# Altium schematic symbol library jlcpcb_2025_04_capacitors_extended_0805.schlib: 3281 symbols (part 8 of 18)
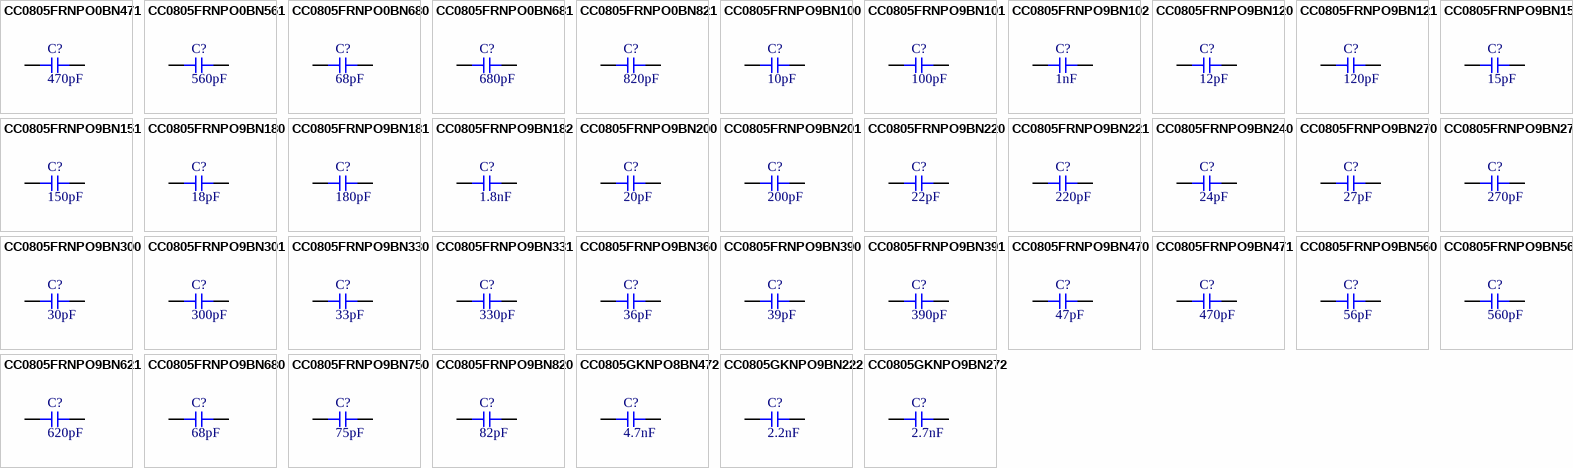
[diagram p89: symbols CC0805FRNPO0BN471 to CC0805GKNPO9BN272]

## CC0805FRNPO0BN680
designator C?  Capacitance: 68pF  (hidden comment: *)
Capacitor, Ceramic (MLCC), 68pF, ±1%, 100V, NP0, ±1%, SMD 0805; Manufacturer: YAGEO; Manufacturer Part Number: CC0805FRNPO0BN680; Package Size: 0805; JLCPCB Basic Part: No; JLCPCB Part Number: C576904; Supplier 1: LCSC; Category: Capacitors - MLCC; Supplier Part Number 1: C576904; Tolerance: ±1%; Voltage Rating: 100V; Temperature Coefficient: NP0; RoHS: Yes; ComponentLink1Description: Datasheet; ComponentLink1URL: https://wmsc.lcsc.com/wmsc/upload/file/pdf/v2/lcsc/2212091030_YAGEO-CC0805FRNPO0BN680_C576904.pdf; ComponentLink2Description: JLCPCB Part URL; ComponentLink2URL: https://jlcpcb.com/partdetail/C576904; ComponentLink3Description: LCSC Part URL; ComponentLink3URL: https://lcsc.com/product-detail/Multilayer-Ceramic-Capacitors-MLCC---SMD-SMT_YAGEO-YAGEO-CC0805FRNPO0BN680_C576904.html
footprint CAP-0805 (0805 (2012M) Capacitor)
pins: 1, 2

## CC0805FRNPO0BN681
designator C?  Capacitance: 680pF  (hidden comment: *)
Capacitor, Ceramic (MLCC), 680pF, ±1%, 100V, NP0, ±1%, SMD 0805; Manufacturer: YAGEO; Manufacturer Part Number: CC0805FRNPO0BN681; Package Size: 0805; JLCPCB Basic Part: No; JLCPCB Part Number: C576905; Supplier 1: LCSC; Category: Capacitors - MLCC; Supplier Part Number 1: C576905; Tolerance: ±1%; Voltage Rating: 100V; Temperature Coefficient: NP0; RoHS: Yes; ComponentLink1Description: Datasheet; ComponentLink1URL: https://wmsc.lcsc.com/wmsc/upload/file/pdf/v2/lcsc/2212222108_YAGEO-CC0805FRNPO0BN681_C576905.pdf; ComponentLink2Description: JLCPCB Part URL; ComponentLink2URL: https://jlcpcb.com/partdetail/C576905; ComponentLink3Description: LCSC Part URL; ComponentLink3URL: https://lcsc.com/product-detail/Multilayer-Ceramic-Capacitors-MLCC---SMD-SMT_YAGEO-YAGEO-CC0805FRNPO0BN681_C576905.html
footprint CAP-0805 (0805 (2012M) Capacitor)
pins: 1, 2

## CC0805FRNPO0BN821
designator C?  Capacitance: 820pF  (hidden comment: *)
Capacitor, Ceramic (MLCC), 820pF, ±1%, 100V, NP0, ±1%, SMD 0805; Manufacturer: YAGEO; Manufacturer Part Number: CC0805FRNPO0BN821; Package Size: 0805; JLCPCB Basic Part: No; JLCPCB Part Number: C576908; Supplier 1: LCSC; Category: Capacitors - MLCC; Supplier Part Number 1: C576908; Tolerance: ±1%; Voltage Rating: 100V; Temperature Coefficient: NP0; RoHS: Yes; ComponentLink1Description: Datasheet; ComponentLink1URL: https://wmsc.lcsc.com/wmsc/upload/file/pdf/v2/lcsc/2211161830_YAGEO-CC0805FRNPO0BN821_C576908.pdf; ComponentLink2Description: JLCPCB Part URL; ComponentLink2URL: https://jlcpcb.com/partdetail/C576908; ComponentLink3Description: LCSC Part URL; ComponentLink3URL: https://lcsc.com/product-detail/Multilayer-Ceramic-Capacitors-MLCC---SMD-SMT_YAGEO-YAGEO-CC0805FRNPO0BN821_C576908.html
footprint CAP-0805 (0805 (2012M) Capacitor)
pins: 1, 2

## CC0805FRNPO9BN100
designator C?  Capacitance: 10pF  (hidden comment: *)
Capacitor, Ceramic (MLCC), 10pF, ±1%, 50V, NP0, ±1%, SMD 0805; Manufacturer: YAGEO; Manufacturer Part Number: CC0805FRNPO9BN100; Package Size: 0805; JLCPCB Basic Part: No; JLCPCB Part Number: C541512; Supplier 1: LCSC; Category: Capacitors - MLCC; Supplier Part Number 1: C541512; Tolerance: ±1%; Voltage Rating: 50V; Temperature Coefficient: NP0; RoHS: Yes; ComponentLink1Description: Datasheet; ComponentLink1URL: https://wmsc.lcsc.com/wmsc/upload/file/pdf/v2/lcsc/2006151142_YAGEO-CC0805FRNPO9BN100_C541512.pdf; ComponentLink2Description: JLCPCB Part URL; ComponentLink2URL: https://jlcpcb.com/partdetail/C541512; ComponentLink3Description: LCSC Part URL; ComponentLink3URL: https://lcsc.com/product-detail/Multilayer-Ceramic-Capacitors-MLCC---SMD-SMT_YAGEO-YAGEO-CC0805FRNPO9BN100_C541512.html
footprint CAP-0805 (0805 (2012M) Capacitor)
pins: 1, 2

## CC0805FRNPO9BN101
designator C?  Capacitance: 100pF  (hidden comment: *)
Capacitor, Ceramic (MLCC), 100pF, 50V, NP0, SMD 0805; Manufacturer: YAGEO; Manufacturer Part Number: CC0805FRNPO9BN101; Package Size: 0805; JLCPCB Basic Part: No; JLCPCB Part Number: C541513; Supplier 1: LCSC; Category: Capacitors - MLCC; Supplier Part Number 1: C541513; Voltage Rating: 50V; Temperature Coefficient: NP0; RoHS: Yes; ComponentLink1Description: Datasheet; ComponentLink1URL: https://wmsc.lcsc.com/wmsc/upload/file/pdf/v2/lcsc/2006151142_YAGEO-CC0805FRNPO9BN101_C541513.pdf; ComponentLink2Description: JLCPCB Part URL; ComponentLink2URL: https://jlcpcb.com/partdetail/C541513; ComponentLink3Description: LCSC Part URL; ComponentLink3URL: https://lcsc.com/product-detail/Multilayer-Ceramic-Capacitors-MLCC---SMD-SMT_YAGEO-YAGEO-CC0805FRNPO9BN101_C541513.html
footprint CAP-0805 (0805 (2012M) Capacitor)
pins: 1, 2

## CC0805FRNPO9BN102
designator C?  Capacitance: 1nF  (hidden comment: *)
Capacitor, Ceramic (MLCC), 1nF, ±1%, 50V, NP0, ±1%, SMD 0805; Manufacturer: YAGEO; Manufacturer Part Number: CC0805FRNPO9BN102; Package Size: 0805; JLCPCB Basic Part: No; JLCPCB Part Number: C326587; Supplier 1: LCSC; Category: Capacitors - MLCC; Supplier Part Number 1: C326587; Tolerance: ±1%; Voltage Rating: 50V; Temperature Coefficient: NP0; RoHS: Yes; ComponentLink1Description: Datasheet; ComponentLink1URL: https://wmsc.lcsc.com/wmsc/upload/file/pdf/v2/lcsc/1811141241_YAGEO-CC0805FRNPO9BN102_C326587.pdf; ComponentLink2Description: JLCPCB Part URL; ComponentLink2URL: https://jlcpcb.com/partdetail/C326587; ComponentLink3Description: LCSC Part URL; ComponentLink3URL: https://lcsc.com/product-detail/Multilayer-Ceramic-Capacitors-MLCC---SMD-SMT_YAGEO-YAGEO-CC0805FRNPO9BN102_C326587.html
footprint CAP-0805 (0805 (2012M) Capacitor)
pins: 1, 2

## CC0805FRNPO9BN120
designator C?  Capacitance: 12pF  (hidden comment: *)
Capacitor, Ceramic (MLCC), 12pF, ±1%, 50V, NP0, ±1%, SMD 0805; Manufacturer: YAGEO; Manufacturer Part Number: CC0805FRNPO9BN120; Package Size: 0805; JLCPCB Basic Part: No; JLCPCB Part Number: C541514; Supplier 1: LCSC; Category: Capacitors - MLCC; Supplier Part Number 1: C541514; Tolerance: ±1%; Voltage Rating: 50V; Temperature Coefficient: NP0; RoHS: Yes; ComponentLink1Description: Datasheet; ComponentLink1URL: https://wmsc.lcsc.com/wmsc/upload/file/pdf/v2/lcsc/2006151142_YAGEO-CC0805FRNPO9BN120_C541514.pdf; ComponentLink2Description: JLCPCB Part URL; ComponentLink2URL: https://jlcpcb.com/partdetail/C541514; ComponentLink3Description: LCSC Part URL; ComponentLink3URL: https://lcsc.com/product-detail/Multilayer-Ceramic-Capacitors-MLCC---SMD-SMT_YAGEO-YAGEO-CC0805FRNPO9BN120_C541514.html
footprint CAP-0805 (0805 (2012M) Capacitor)
pins: 1, 2

## CC0805FRNPO9BN121
designator C?  Capacitance: 120pF  (hidden comment: *)
Capacitor, Ceramic (MLCC), 120pF, ±1%, 50V, NP0, ±1%, SMD 0805; Manufacturer: YAGEO; Manufacturer Part Number: CC0805FRNPO9BN121; Package Size: 0805; JLCPCB Basic Part: No; JLCPCB Part Number: C527076; Supplier 1: LCSC; Category: Capacitors - MLCC; Supplier Part Number 1: C527076; Tolerance: ±1%; Voltage Rating: 50V; Temperature Coefficient: NP0; RoHS: Yes; ComponentLink1Description: Datasheet; ComponentLink1URL: https://wmsc.lcsc.com/wmsc/upload/file/pdf/v2/lcsc/2006181535_YAGEO-CC0805FRNPO9BN121_C527076.pdf; ComponentLink2Description: JLCPCB Part URL; ComponentLink2URL: https://jlcpcb.com/partdetail/C527076; ComponentLink3Description: LCSC Part URL; ComponentLink3URL: https://lcsc.com/product-detail/Multilayer-Ceramic-Capacitors-MLCC---SMD-SMT_YAGEO-YAGEO-CC0805FRNPO9BN121_C527076.html
footprint CAP-0805 (0805 (2012M) Capacitor)
pins: 1, 2

## CC0805FRNPO9BN150
designator C?  Capacitance: 15pF  (hidden comment: *)
Capacitor, Ceramic (MLCC), 15pF, ±1%, 50V, NP0, ±1%, SMD 0805; Manufacturer: YAGEO; Manufacturer Part Number: CC0805FRNPO9BN150; Package Size: 0805; JLCPCB Basic Part: No; JLCPCB Part Number: C527077; Supplier 1: LCSC; Category: Capacitors - MLCC; Supplier Part Number 1: C527077; Tolerance: ±1%; Voltage Rating: 50V; Temperature Coefficient: NP0; RoHS: Yes; ComponentLink1Description: Datasheet; ComponentLink1URL: https://wmsc.lcsc.com/wmsc/upload/file/pdf/v2/lcsc/2006101835_YAGEO-CC0805FRNPO9BN150_C527077.pdf; ComponentLink2Description: JLCPCB Part URL; ComponentLink2URL: https://jlcpcb.com/partdetail/C527077; ComponentLink3Description: LCSC Part URL; ComponentLink3URL: https://lcsc.com/product-detail/Multilayer-Ceramic-Capacitors-MLCC---SMD-SMT_YAGEO-YAGEO-CC0805FRNPO9BN150_C527077.html
footprint CAP-0805 (0805 (2012M) Capacitor)
pins: 1, 2

## CC0805FRNPO9BN151
designator C?  Capacitance: 150pF  (hidden comment: *)
Capacitor, Ceramic (MLCC), 150pF, ±1%, 50V, NP0, ±1%, SMD 0805; Manufacturer: YAGEO; Manufacturer Part Number: CC0805FRNPO9BN151; Package Size: 0805; JLCPCB Basic Part: No; JLCPCB Part Number: C527078; Supplier 1: LCSC; Category: Capacitors - MLCC; Supplier Part Number 1: C527078; Tolerance: ±1%; Voltage Rating: 50V; Temperature Coefficient: NP0; RoHS: Yes; ComponentLink1Description: Datasheet; ComponentLink1URL: https://wmsc.lcsc.com/wmsc/upload/file/pdf/v2/lcsc/2006101835_YAGEO-CC0805FRNPO9BN151_C527078.pdf; ComponentLink2Description: JLCPCB Part URL; ComponentLink2URL: https://jlcpcb.com/partdetail/C527078; ComponentLink3Description: LCSC Part URL; ComponentLink3URL: https://lcsc.com/product-detail/Multilayer-Ceramic-Capacitors-MLCC---SMD-SMT_YAGEO-YAGEO-CC0805FRNPO9BN151_C527078.html
footprint CAP-0805 (0805 (2012M) Capacitor)
pins: 1, 2

## CC0805FRNPO9BN180
designator C?  Capacitance: 18pF  (hidden comment: *)
Capacitor, Ceramic (MLCC), 18pF, ±1%, 50V, NP0, ±1%, SMD 0805; Manufacturer: YAGEO; Manufacturer Part Number: CC0805FRNPO9BN180; Package Size: 0805; JLCPCB Basic Part: No; JLCPCB Part Number: C527079; Supplier 1: LCSC; Category: Capacitors - MLCC; Supplier Part Number 1: C527079; Tolerance: ±1%; Voltage Rating: 50V; Temperature Coefficient: NP0; RoHS: Yes; ComponentLink1Description: Datasheet; ComponentLink1URL: https://wmsc.lcsc.com/wmsc/upload/file/pdf/v2/lcsc/2007171236_YAGEO-CC0805FRNPO9BN180_C527079.pdf; ComponentLink2Description: JLCPCB Part URL; ComponentLink2URL: https://jlcpcb.com/partdetail/C527079; ComponentLink3Description: LCSC Part URL; ComponentLink3URL: https://lcsc.com/product-detail/Multilayer-Ceramic-Capacitors-MLCC---SMD-SMT_YAGEO-YAGEO-CC0805FRNPO9BN180_C527079.html
footprint CAP-0805 (0805 (2012M) Capacitor)
pins: 1, 2

## CC0805FRNPO9BN181
designator C?  Capacitance: 180pF  (hidden comment: *)
Capacitor, Ceramic (MLCC), 180pF, ±1%, 50V, NP0, ±1%, SMD 0805; Manufacturer: YAGEO; Manufacturer Part Number: CC0805FRNPO9BN181; Package Size: 0805; JLCPCB Basic Part: No; JLCPCB Part Number: C527080; Supplier 1: LCSC; Category: Capacitors - MLCC; Supplier Part Number 1: C527080; Tolerance: ±1%; Voltage Rating: 50V; Temperature Coefficient: NP0; RoHS: Yes; ComponentLink1Description: Datasheet; ComponentLink1URL: https://wmsc.lcsc.com/wmsc/upload/file/pdf/v2/lcsc/2007091834_YAGEO-CC0805FRNPO9BN181_C527080.pdf; ComponentLink2Description: JLCPCB Part URL; ComponentLink2URL: https://jlcpcb.com/partdetail/C527080; ComponentLink3Description: LCSC Part URL; ComponentLink3URL: https://lcsc.com/product-detail/Multilayer-Ceramic-Capacitors-MLCC---SMD-SMT_YAGEO-YAGEO-CC0805FRNPO9BN181_C527080.html
footprint CAP-0805 (0805 (2012M) Capacitor)
pins: 1, 2

## CC0805FRNPO9BN182
designator C?  Capacitance: 1.8nF  (hidden comment: *)
Capacitor, Ceramic (MLCC), 1.8nF, ±1%, 50V, NP0, ±1%, SMD 0805; Manufacturer: YAGEO; Manufacturer Part Number: CC0805FRNPO9BN182; Package Size: 0805; JLCPCB Basic Part: No; JLCPCB Part Number: C541573; Supplier 1: LCSC; Category: Capacitors - MLCC; Supplier Part Number 1: C541573; Tolerance: ±1%; Voltage Rating: 50V; Temperature Coefficient: NP0; RoHS: Yes; ComponentLink1Description: Datasheet; ComponentLink1URL: https://wmsc.lcsc.com/wmsc/upload/file/pdf/v2/lcsc/2006151213_YAGEO-CC0805FRNPO9BN182_C541573.pdf; ComponentLink2Description: JLCPCB Part URL; ComponentLink2URL: https://jlcpcb.com/partdetail/C541573; ComponentLink3Description: LCSC Part URL; ComponentLink3URL: https://lcsc.com/product-detail/Multilayer-Ceramic-Capacitors-MLCC---SMD-SMT_YAGEO-YAGEO-CC0805FRNPO9BN182_C541573.html
footprint CAP-0805 (0805 (2012M) Capacitor)
pins: 1, 2

## CC0805FRNPO9BN200
designator C?  Capacitance: 20pF  (hidden comment: *)
Capacitor, Ceramic (MLCC), 20pF, ±1%, 50V, NP0, ±1%, SMD 0805; Manufacturer: YAGEO; Manufacturer Part Number: CC0805FRNPO9BN200; Package Size: 0805; JLCPCB Basic Part: No; JLCPCB Part Number: C527081; Supplier 1: LCSC; Category: Capacitors - MLCC; Supplier Part Number 1: C527081; Tolerance: ±1%; Voltage Rating: 50V; Temperature Coefficient: NP0; RoHS: Yes; ComponentLink1Description: Datasheet; ComponentLink1URL: https://wmsc.lcsc.com/wmsc/upload/file/pdf/v2/lcsc/2005262134_YAGEO-CC0805FRNPO9BN200_C527081.pdf; ComponentLink2Description: JLCPCB Part URL; ComponentLink2URL: https://jlcpcb.com/partdetail/C527081; ComponentLink3Description: LCSC Part URL; ComponentLink3URL: https://lcsc.com/product-detail/Multilayer-Ceramic-Capacitors-MLCC---SMD-SMT_YAGEO-YAGEO-CC0805FRNPO9BN200_C527081.html
footprint CAP-0805 (0805 (2012M) Capacitor)
pins: 1, 2

## CC0805FRNPO9BN201
designator C?  Capacitance: 200pF  (hidden comment: *)
Capacitor, Ceramic (MLCC), 200pF, 50V, NP0, SMD 0805; Manufacturer: YAGEO; Manufacturer Part Number: CC0805FRNPO9BN201; Package Size: 0805; JLCPCB Basic Part: No; JLCPCB Part Number: C541566; Supplier 1: LCSC; Category: Capacitors - MLCC; Supplier Part Number 1: C541566; Voltage Rating: 50V; Temperature Coefficient: NP0; RoHS: Yes; ComponentLink1Description: Datasheet; ComponentLink1URL: https://wmsc.lcsc.com/wmsc/upload/file/pdf/v2/lcsc/2006151213_YAGEO-CC0805FRNPO9BN201_C541566.pdf; ComponentLink2Description: JLCPCB Part URL; ComponentLink2URL: https://jlcpcb.com/partdetail/C541566; ComponentLink3Description: LCSC Part URL; ComponentLink3URL: https://lcsc.com/product-detail/Multilayer-Ceramic-Capacitors-MLCC---SMD-SMT_YAGEO-YAGEO-CC0805FRNPO9BN201_C541566.html
footprint CAP-0805 (0805 (2012M) Capacitor)
pins: 1, 2

## CC0805FRNPO9BN220
designator C?  Capacitance: 22pF  (hidden comment: *)
Capacitor, Ceramic (MLCC), 22pF, ±1%, 50V, NP0, ±1%, SMD 0805; Manufacturer: YAGEO; Manufacturer Part Number: CC0805FRNPO9BN220; Package Size: 0805; JLCPCB Basic Part: No; JLCPCB Part Number: C541515; Supplier 1: LCSC; Category: Capacitors - MLCC; Supplier Part Number 1: C541515; Tolerance: ±1%; Voltage Rating: 50V; Temperature Coefficient: NP0; RoHS: Yes; ComponentLink1Description: Datasheet; ComponentLink1URL: https://wmsc.lcsc.com/wmsc/upload/file/pdf/v2/lcsc/2006151142_YAGEO-CC0805FRNPO9BN220_C541515.pdf; ComponentLink2Description: JLCPCB Part URL; ComponentLink2URL: https://jlcpcb.com/partdetail/C541515; ComponentLink3Description: LCSC Part URL; ComponentLink3URL: https://lcsc.com/product-detail/Multilayer-Ceramic-Capacitors-MLCC---SMD-SMT_YAGEO-YAGEO-CC0805FRNPO9BN220_C541515.html
footprint CAP-0805 (0805 (2012M) Capacitor)
pins: 1, 2

## CC0805FRNPO9BN221
designator C?  Capacitance: 220pF  (hidden comment: *)
Capacitor, Ceramic (MLCC), 220pF, 50V, NP0, SMD 0805; Manufacturer: YAGEO; Manufacturer Part Number: CC0805FRNPO9BN221; Package Size: 0805; JLCPCB Basic Part: No; JLCPCB Part Number: C541563; Supplier 1: LCSC; Category: Capacitors - MLCC; Supplier Part Number 1: C541563; Voltage Rating: 50V; Temperature Coefficient: NP0; RoHS: Yes; ComponentLink1Description: Datasheet; ComponentLink1URL: https://wmsc.lcsc.com/wmsc/upload/file/pdf/v2/lcsc/2006151213_YAGEO-CC0805FRNPO9BN221_C541563.pdf; ComponentLink2Description: JLCPCB Part URL; ComponentLink2URL: https://jlcpcb.com/partdetail/C541563; ComponentLink3Description: LCSC Part URL; ComponentLink3URL: https://lcsc.com/product-detail/Multilayer-Ceramic-Capacitors-MLCC---SMD-SMT_YAGEO-YAGEO-CC0805FRNPO9BN221_C541563.html
footprint CAP-0805 (0805 (2012M) Capacitor)
pins: 1, 2

## CC0805FRNPO9BN240
designator C?  Capacitance: 24pF  (hidden comment: *)
Capacitor, Ceramic (MLCC), 24pF, ±1%, 50V, NP0, ±1%, SMD 0805; Manufacturer: YAGEO; Manufacturer Part Number: CC0805FRNPO9BN240; Package Size: 0805; JLCPCB Basic Part: No; JLCPCB Part Number: C527082; Supplier 1: LCSC; Category: Capacitors - MLCC; Supplier Part Number 1: C527082; Tolerance: ±1%; Voltage Rating: 50V; Temperature Coefficient: NP0; RoHS: Yes; ComponentLink1Description: Datasheet; ComponentLink1URL: https://wmsc.lcsc.com/wmsc/upload/file/pdf/v2/lcsc/2008201233_YAGEO-CC0805FRNPO9BN240_C527082.pdf; ComponentLink2Description: JLCPCB Part URL; ComponentLink2URL: https://jlcpcb.com/partdetail/C527082; ComponentLink3Description: LCSC Part URL; ComponentLink3URL: https://lcsc.com/product-detail/Multilayer-Ceramic-Capacitors-MLCC---SMD-SMT_YAGEO-YAGEO-CC0805FRNPO9BN240_C527082.html
footprint CAP-0805 (0805 (2012M) Capacitor)
pins: 1, 2

## CC0805FRNPO9BN270
designator C?  Capacitance: 27pF  (hidden comment: *)
Capacitor, Ceramic (MLCC), 27pF, ±1%, 50V, NP0, ±1%, SMD 0805; Manufacturer: YAGEO; Manufacturer Part Number: CC0805FRNPO9BN270; Package Size: 0805; JLCPCB Basic Part: No; JLCPCB Part Number: C527182; Supplier 1: LCSC; Category: Capacitors - MLCC; Supplier Part Number 1: C527182; Tolerance: ±1%; Voltage Rating: 50V; Temperature Coefficient: NP0; RoHS: Yes; ComponentLink1Description: Datasheet; ComponentLink1URL: https://wmsc.lcsc.com/wmsc/upload/file/pdf/v2/lcsc/2008201233_YAGEO-CC0805FRNPO9BN270_C527182.pdf; ComponentLink2Description: JLCPCB Part URL; ComponentLink2URL: https://jlcpcb.com/partdetail/C527182; ComponentLink3Description: LCSC Part URL; ComponentLink3URL: https://lcsc.com/product-detail/Multilayer-Ceramic-Capacitors-MLCC---SMD-SMT_YAGEO-YAGEO-CC0805FRNPO9BN270_C527182.html
footprint CAP-0805 (0805 (2012M) Capacitor)
pins: 1, 2

## CC0805FRNPO9BN271
designator C?  Capacitance: 270pF  (hidden comment: *)
Capacitor, Ceramic (MLCC), 270pF, ±1%, 50V, NP0, ±1%, SMD 0805; Manufacturer: YAGEO; Manufacturer Part Number: CC0805FRNPO9BN271; Package Size: 0805; JLCPCB Basic Part: No; JLCPCB Part Number: C527183; Supplier 1: LCSC; Category: Capacitors - MLCC; Supplier Part Number 1: C527183; Tolerance: ±1%; Voltage Rating: 50V; Temperature Coefficient: NP0; RoHS: Yes; ComponentLink1Description: Datasheet; ComponentLink1URL: https://wmsc.lcsc.com/wmsc/upload/file/pdf/v2/lcsc/2005262134_YAGEO-CC0805FRNPO9BN271_C527183.pdf; ComponentLink2Description: JLCPCB Part URL; ComponentLink2URL: https://jlcpcb.com/partdetail/C527183; ComponentLink3Description: LCSC Part URL; ComponentLink3URL: https://lcsc.com/product-detail/Multilayer-Ceramic-Capacitors-MLCC---SMD-SMT_YAGEO-YAGEO-CC0805FRNPO9BN271_C527183.html
footprint CAP-0805 (0805 (2012M) Capacitor)
pins: 1, 2

## CC0805FRNPO9BN300
designator C?  Capacitance: 30pF  (hidden comment: *)
Capacitor, Ceramic (MLCC), 30pF, ±1%, 50V, NP0, ±1%, SMD 0805; Manufacturer: YAGEO; Manufacturer Part Number: CC0805FRNPO9BN300; Package Size: 0805; JLCPCB Basic Part: No; JLCPCB Part Number: C527184; Supplier 1: LCSC; Category: Capacitors - MLCC; Supplier Part Number 1: C527184; Tolerance: ±1%; Voltage Rating: 50V; Temperature Coefficient: NP0; RoHS: Yes; ComponentLink1Description: Datasheet; ComponentLink1URL: https://wmsc.lcsc.com/wmsc/upload/file/pdf/v2/lcsc/2006241834_YAGEO-CC0805FRNPO9BN300_C527184.pdf; ComponentLink2Description: JLCPCB Part URL; ComponentLink2URL: https://jlcpcb.com/partdetail/C527184; ComponentLink3Description: LCSC Part URL; ComponentLink3URL: https://lcsc.com/product-detail/Multilayer-Ceramic-Capacitors-MLCC---SMD-SMT_YAGEO-YAGEO-CC0805FRNPO9BN300_C527184.html
footprint CAP-0805 (0805 (2012M) Capacitor)
pins: 1, 2

## CC0805FRNPO9BN301
designator C?  Capacitance: 300pF  (hidden comment: *)
Capacitor, Ceramic (MLCC), 300pF, 50V, NP0, SMD 0805; Manufacturer: YAGEO; Manufacturer Part Number: CC0805FRNPO9BN301; Package Size: 0805; JLCPCB Basic Part: No; JLCPCB Part Number: C541567; Supplier 1: LCSC; Category: Capacitors - MLCC; Supplier Part Number 1: C541567; Voltage Rating: 50V; Temperature Coefficient: NP0; RoHS: Yes; ComponentLink1Description: Datasheet; ComponentLink1URL: https://wmsc.lcsc.com/wmsc/upload/file/pdf/v2/lcsc/2006151213_YAGEO-CC0805FRNPO9BN301_C541567.pdf; ComponentLink2Description: JLCPCB Part URL; ComponentLink2URL: https://jlcpcb.com/partdetail/C541567; ComponentLink3Description: LCSC Part URL; ComponentLink3URL: https://lcsc.com/product-detail/Multilayer-Ceramic-Capacitors-MLCC---SMD-SMT_YAGEO-YAGEO-CC0805FRNPO9BN301_C541567.html
footprint CAP-0805 (0805 (2012M) Capacitor)
pins: 1, 2

## CC0805FRNPO9BN330
designator C?  Capacitance: 33pF  (hidden comment: *)
Capacitor, Ceramic (MLCC), 33pF, ±1%, 50V, NP0, ±1%, SMD 0805; Manufacturer: YAGEO; Manufacturer Part Number: CC0805FRNPO9BN330; Package Size: 0805; JLCPCB Basic Part: No; JLCPCB Part Number: C541516; Supplier 1: LCSC; Category: Capacitors - MLCC; Supplier Part Number 1: C541516; Tolerance: ±1%; Voltage Rating: 50V; Temperature Coefficient: NP0; RoHS: Yes; ComponentLink1Description: Datasheet; ComponentLink1URL: https://wmsc.lcsc.com/wmsc/upload/file/pdf/v2/lcsc/2006151142_YAGEO-CC0805FRNPO9BN330_C541516.pdf; ComponentLink2Description: JLCPCB Part URL; ComponentLink2URL: https://jlcpcb.com/partdetail/C541516; ComponentLink3Description: LCSC Part URL; ComponentLink3URL: https://lcsc.com/product-detail/Multilayer-Ceramic-Capacitors-MLCC---SMD-SMT_YAGEO-YAGEO-CC0805FRNPO9BN330_C541516.html
footprint CAP-0805 (0805 (2012M) Capacitor)
pins: 1, 2

## CC0805FRNPO9BN331
designator C?  Capacitance: 330pF  (hidden comment: *)
Capacitor, Ceramic (MLCC), 330pF, ±1%, 50V, NP0, ±1%, SMD 0805; Manufacturer: YAGEO; Manufacturer Part Number: CC0805FRNPO9BN331; Package Size: 0805; JLCPCB Basic Part: No; JLCPCB Part Number: C541564; Supplier 1: LCSC; Category: Capacitors - MLCC; Supplier Part Number 1: C541564; Tolerance: ±1%; Voltage Rating: 50V; Temperature Coefficient: NP0; RoHS: Yes; ComponentLink1Description: Datasheet; ComponentLink1URL: https://wmsc.lcsc.com/wmsc/upload/file/pdf/v2/lcsc/2006151213_YAGEO-CC0805FRNPO9BN331_C541564.pdf; ComponentLink2Description: JLCPCB Part URL; ComponentLink2URL: https://jlcpcb.com/partdetail/C541564; ComponentLink3Description: LCSC Part URL; ComponentLink3URL: https://lcsc.com/product-detail/Multilayer-Ceramic-Capacitors-MLCC---SMD-SMT_YAGEO-YAGEO-CC0805FRNPO9BN331_C541564.html
footprint CAP-0805 (0805 (2012M) Capacitor)
pins: 1, 2

## CC0805FRNPO9BN360
designator C?  Capacitance: 36pF  (hidden comment: *)
Capacitor, Ceramic (MLCC), 36pF, ±1%, 50V, NP0, ±1%, SMD 0805; Manufacturer: YAGEO; Manufacturer Part Number: CC0805FRNPO9BN360; Package Size: 0805; JLCPCB Basic Part: No; JLCPCB Part Number: C541518; Supplier 1: LCSC; Category: Capacitors - MLCC; Supplier Part Number 1: C541518; Tolerance: ±1%; Voltage Rating: 50V; Temperature Coefficient: NP0; RoHS: Yes; ComponentLink1Description: Datasheet; ComponentLink1URL: https://wmsc.lcsc.com/wmsc/upload/file/pdf/v2/lcsc/2006151142_YAGEO-CC0805FRNPO9BN360_C541518.pdf; ComponentLink2Description: JLCPCB Part URL; ComponentLink2URL: https://jlcpcb.com/partdetail/C541518; ComponentLink3Description: LCSC Part URL; ComponentLink3URL: https://lcsc.com/product-detail/Multilayer-Ceramic-Capacitors-MLCC---SMD-SMT_YAGEO-YAGEO-CC0805FRNPO9BN360_C541518.html
footprint CAP-0805 (0805 (2012M) Capacitor)
pins: 1, 2

## CC0805FRNPO9BN390
designator C?  Capacitance: 39pF  (hidden comment: *)
Capacitor, Ceramic (MLCC), 39pF, ±1%, 50V, NP0, ±1%, SMD 0805; Manufacturer: YAGEO; Manufacturer Part Number: CC0805FRNPO9BN390; Package Size: 0805; JLCPCB Basic Part: No; JLCPCB Part Number: C527185; Supplier 1: LCSC; Category: Capacitors - MLCC; Supplier Part Number 1: C527185; Tolerance: ±1%; Voltage Rating: 50V; Temperature Coefficient: NP0; RoHS: Yes; ComponentLink1Description: Datasheet; ComponentLink1URL: https://wmsc.lcsc.com/wmsc/upload/file/pdf/v2/lcsc/2005262134_YAGEO-CC0805FRNPO9BN390_C527185.pdf; ComponentLink2Description: JLCPCB Part URL; ComponentLink2URL: https://jlcpcb.com/partdetail/C527185; ComponentLink3Description: LCSC Part URL; ComponentLink3URL: https://lcsc.com/product-detail/Multilayer-Ceramic-Capacitors-MLCC---SMD-SMT_YAGEO-YAGEO-CC0805FRNPO9BN390_C527185.html
footprint CAP-0805 (0805 (2012M) Capacitor)
pins: 1, 2

## CC0805FRNPO9BN391
designator C?  Capacitance: 390pF  (hidden comment: *)
Capacitor, Ceramic (MLCC), 390pF, ±1%, 50V, NP0, ±1%, SMD 0805; Manufacturer: YAGEO; Manufacturer Part Number: CC0805FRNPO9BN391; Package Size: 0805; JLCPCB Basic Part: No; JLCPCB Part Number: C527186; Supplier 1: LCSC; Category: Capacitors - MLCC; Supplier Part Number 1: C527186; Tolerance: ±1%; Voltage Rating: 50V; Temperature Coefficient: NP0; RoHS: Yes; ComponentLink1Description: Datasheet; ComponentLink1URL: https://wmsc.lcsc.com/wmsc/upload/file/pdf/v2/lcsc/2007171236_YAGEO-CC0805FRNPO9BN391_C527186.pdf; ComponentLink2Description: JLCPCB Part URL; ComponentLink2URL: https://jlcpcb.com/partdetail/C527186; ComponentLink3Description: LCSC Part URL; ComponentLink3URL: https://lcsc.com/product-detail/Multilayer-Ceramic-Capacitors-MLCC---SMD-SMT_YAGEO-YAGEO-CC0805FRNPO9BN391_C527186.html
footprint CAP-0805 (0805 (2012M) Capacitor)
pins: 1, 2

## CC0805FRNPO9BN470
designator C?  Capacitance: 47pF  (hidden comment: *)
Capacitor, Ceramic (MLCC), 47pF, ±1%, 50V, NP0, ±1%, SMD 0805; Manufacturer: YAGEO; Manufacturer Part Number: CC0805FRNPO9BN470; Package Size: 0805; JLCPCB Basic Part: No; JLCPCB Part Number: C326999; Supplier 1: LCSC; Category: Capacitors - MLCC; Supplier Part Number 1: C326999; Tolerance: ±1%; Voltage Rating: 50V; Temperature Coefficient: NP0; RoHS: Yes; ComponentLink1Description: Datasheet; ComponentLink1URL: https://wmsc.lcsc.com/wmsc/upload/file/pdf/v2/lcsc/1811141228_YAGEO-CC0805FRNPO9BN470_C326999.pdf; ComponentLink2Description: JLCPCB Part URL; ComponentLink2URL: https://jlcpcb.com/partdetail/C326999; ComponentLink3Description: LCSC Part URL; ComponentLink3URL: https://lcsc.com/product-detail/Multilayer-Ceramic-Capacitors-MLCC---SMD-SMT_YAGEO-YAGEO-CC0805FRNPO9BN470_C326999.html
footprint CAP-0805 (0805 (2012M) Capacitor)
pins: 1, 2

## CC0805FRNPO9BN471
designator C?  Capacitance: 470pF  (hidden comment: *)
Capacitor, Ceramic (MLCC), 470pF, ±1%, 50V, NP0, ±1%, SMD 0805; Manufacturer: YAGEO; Manufacturer Part Number: CC0805FRNPO9BN471; Package Size: 0805; JLCPCB Basic Part: No; JLCPCB Part Number: C118895; Supplier 1: LCSC; Category: Capacitors - MLCC; Supplier Part Number 1: C118895; Tolerance: ±1%; Voltage Rating: 50V; Temperature Coefficient: NP0; RoHS: Yes; ComponentLink1Description: Datasheet; ComponentLink1URL: https://wmsc.lcsc.com/wmsc/upload/file/pdf/v2/lcsc/2304140030_YAGEO-CC0805FRNPO9BN471_C118895.pdf; ComponentLink2Description: JLCPCB Part URL; ComponentLink2URL: https://jlcpcb.com/partdetail/C118895; ComponentLink3Description: LCSC Part URL; ComponentLink3URL: https://lcsc.com/product-detail/Multilayer-Ceramic-Capacitors-MLCC---SMD-SMT_YAGEO-YAGEO-CC0805FRNPO9BN471_C118895.html
footprint CAP-0805 (0805 (2012M) Capacitor)
pins: 1, 2

## CC0805FRNPO9BN560
designator C?  Capacitance: 56pF  (hidden comment: *)
Capacitor, Ceramic (MLCC), 56pF, ±1%, 50V, NP0, ±1%, SMD 0805; Manufacturer: YAGEO; Manufacturer Part Number: CC0805FRNPO9BN560; Package Size: 0805; JLCPCB Basic Part: No; JLCPCB Part Number: C527187; Supplier 1: LCSC; Category: Capacitors - MLCC; Supplier Part Number 1: C527187; Tolerance: ±1%; Voltage Rating: 50V; Temperature Coefficient: NP0; RoHS: Yes; ComponentLink1Description: Datasheet; ComponentLink1URL: https://wmsc.lcsc.com/wmsc/upload/file/pdf/v2/lcsc/2007091834_YAGEO-CC0805FRNPO9BN560_C527187.pdf; ComponentLink2Description: JLCPCB Part URL; ComponentLink2URL: https://jlcpcb.com/partdetail/C527187; ComponentLink3Description: LCSC Part URL; ComponentLink3URL: https://lcsc.com/product-detail/Multilayer-Ceramic-Capacitors-MLCC---SMD-SMT_YAGEO-YAGEO-CC0805FRNPO9BN560_C527187.html
footprint CAP-0805 (0805 (2012M) Capacitor)
pins: 1, 2

## CC0805FRNPO9BN561
designator C?  Capacitance: 560pF  (hidden comment: *)
Capacitor, Ceramic (MLCC), 560pF, ±1%, 50V, NP0, ±1%, SMD 0805; Manufacturer: YAGEO; Manufacturer Part Number: CC0805FRNPO9BN561; Package Size: 0805; JLCPCB Basic Part: No; JLCPCB Part Number: C527188; Supplier 1: LCSC; Category: Capacitors - MLCC; Supplier Part Number 1: C527188; Tolerance: ±1%; Voltage Rating: 50V; Temperature Coefficient: NP0; RoHS: Yes; ComponentLink1Description: Datasheet; ComponentLink1URL: https://wmsc.lcsc.com/wmsc/upload/file/pdf/v2/lcsc/2005261832_YAGEO-CC0805FRNPO9BN561_C527188.pdf; ComponentLink2Description: JLCPCB Part URL; ComponentLink2URL: https://jlcpcb.com/partdetail/C527188; ComponentLink3Description: LCSC Part URL; ComponentLink3URL: https://lcsc.com/product-detail/Multilayer-Ceramic-Capacitors-MLCC---SMD-SMT_YAGEO-YAGEO-CC0805FRNPO9BN561_C527188.html
footprint CAP-0805 (0805 (2012M) Capacitor)
pins: 1, 2

## CC0805FRNPO9BN621
designator C?  Capacitance: 620pF  (hidden comment: *)
Capacitor, Ceramic (MLCC), 620pF, 50V, NP0, SMD 0805; Manufacturer: YAGEO; Manufacturer Part Number: CC0805FRNPO9BN621; Package Size: 0805; JLCPCB Basic Part: No; JLCPCB Part Number: C541568; Supplier 1: LCSC; Category: Capacitors - MLCC; Supplier Part Number 1: C541568; Voltage Rating: 50V; Temperature Coefficient: NP0; RoHS: Yes; ComponentLink1Description: Datasheet; ComponentLink1URL: https://wmsc.lcsc.com/wmsc/upload/file/pdf/v2/lcsc/2006151213_YAGEO-CC0805FRNPO9BN621_C541568.pdf; ComponentLink2Description: JLCPCB Part URL; ComponentLink2URL: https://jlcpcb.com/partdetail/C541568; ComponentLink3Description: LCSC Part URL; ComponentLink3URL: https://lcsc.com/product-detail/Multilayer-Ceramic-Capacitors-MLCC---SMD-SMT_YAGEO-YAGEO-CC0805FRNPO9BN621_C541568.html
footprint CAP-0805 (0805 (2012M) Capacitor)
pins: 1, 2

## CC0805FRNPO9BN680
designator C?  Capacitance: 68pF  (hidden comment: *)
Capacitor, Ceramic (MLCC), 68pF, ±1%, 50V, NP0, ±1%, SMD 0805; Manufacturer: YAGEO; Manufacturer Part Number: CC0805FRNPO9BN680; Package Size: 0805; JLCPCB Basic Part: No; JLCPCB Part Number: C541517; Supplier 1: LCSC; Category: Capacitors - MLCC; Supplier Part Number 1: C541517; Tolerance: ±1%; Voltage Rating: 50V; Temperature Coefficient: NP0; RoHS: Yes; ComponentLink1Description: Datasheet; ComponentLink1URL: https://wmsc.lcsc.com/wmsc/upload/file/pdf/v2/lcsc/2006151142_YAGEO-CC0805FRNPO9BN680_C541517.pdf; ComponentLink2Description: JLCPCB Part URL; ComponentLink2URL: https://jlcpcb.com/partdetail/C541517; ComponentLink3Description: LCSC Part URL; ComponentLink3URL: https://lcsc.com/product-detail/Multilayer-Ceramic-Capacitors-MLCC---SMD-SMT_YAGEO-YAGEO-CC0805FRNPO9BN680_C541517.html
footprint CAP-0805 (0805 (2012M) Capacitor)
pins: 1, 2

## CC0805FRNPO9BN750
designator C?  Capacitance: 75pF  (hidden comment: *)
Capacitor, Ceramic (MLCC), 75pF, 50V, NP0, SMD 0805; Manufacturer: YAGEO; Manufacturer Part Number: CC0805FRNPO9BN750; Package Size: 0805; JLCPCB Basic Part: No; JLCPCB Part Number: C541521; Supplier 1: LCSC; Category: Capacitors - MLCC; Supplier Part Number 1: C541521; Voltage Rating: 50V; Temperature Coefficient: NP0; RoHS: Yes; ComponentLink1Description: Datasheet; ComponentLink1URL: https://wmsc.lcsc.com/wmsc/upload/file/pdf/v2/lcsc/2006151143_YAGEO-CC0805FRNPO9BN750_C541521.pdf; ComponentLink2Description: JLCPCB Part URL; ComponentLink2URL: https://jlcpcb.com/partdetail/C541521; ComponentLink3Description: LCSC Part URL; ComponentLink3URL: https://lcsc.com/product-detail/Multilayer-Ceramic-Capacitors-MLCC---SMD-SMT_YAGEO-YAGEO-CC0805FRNPO9BN750_C541521.html
footprint CAP-0805 (0805 (2012M) Capacitor)
pins: 1, 2

## CC0805FRNPO9BN820
designator C?  Capacitance: 82pF  (hidden comment: *)
Capacitor, Ceramic (MLCC), 82pF, ±1%, 50V, NP0, ±1%, SMD 0805; Manufacturer: YAGEO; Manufacturer Part Number: CC0805FRNPO9BN820; Package Size: 0805; JLCPCB Basic Part: No; JLCPCB Part Number: C527189; Supplier 1: LCSC; Category: Capacitors - MLCC; Supplier Part Number 1: C527189; Tolerance: ±1%; Voltage Rating: 50V; Temperature Coefficient: NP0; RoHS: Yes; ComponentLink1Description: Datasheet; ComponentLink1URL: https://wmsc.lcsc.com/wmsc/upload/file/pdf/v2/lcsc/2007221234_YAGEO-CC0805FRNPO9BN820_C527189.pdf; ComponentLink2Description: JLCPCB Part URL; ComponentLink2URL: https://jlcpcb.com/partdetail/C527189; ComponentLink3Description: LCSC Part URL; ComponentLink3URL: https://lcsc.com/product-detail/Multilayer-Ceramic-Capacitors-MLCC---SMD-SMT_YAGEO-YAGEO-CC0805FRNPO9BN820_C527189.html
footprint CAP-0805 (0805 (2012M) Capacitor)
pins: 1, 2

## CC0805GKNPO8BN472
designator C?  Capacitance: 4.7nF  (hidden comment: *)
Capacitor, Ceramic (MLCC), 4.7nF, ±2%, 25V, NP0, ±2%, SMD 0805; Manufacturer: YAGEO; Manufacturer Part Number: CC0805GKNPO8BN472; Package Size: 0805; JLCPCB Basic Part: No; JLCPCB Part Number: C541556; Supplier 1: LCSC; Category: Capacitors - MLCC; Supplier Part Number 1: C541556; Tolerance: ±2%; Voltage Rating: 25V; Temperature Coefficient: NP0; RoHS: Yes; ComponentLink1Description: Datasheet; ComponentLink1URL: https://wmsc.lcsc.com/wmsc/upload/file/pdf/v2/lcsc/2006151145_YAGEO-CC0805GKNPO8BN472_C541556.pdf; ComponentLink2Description: JLCPCB Part URL; ComponentLink2URL: https://jlcpcb.com/partdetail/C541556; ComponentLink3Description: LCSC Part URL; ComponentLink3URL: https://lcsc.com/product-detail/Multilayer-Ceramic-Capacitors-MLCC---SMD-SMT_YAGEO-YAGEO-CC0805GKNPO8BN472_C541556.html
footprint CAP-0805 (0805 (2012M) Capacitor)
pins: 1, 2

## CC0805GKNPO9BN222
designator C?  Capacitance: 2.2nF  (hidden comment: *)
Capacitor, Ceramic (MLCC), 2.2nF, ±2%, 50V, NP0, ±2%, SMD 0805; Manufacturer: YAGEO; Manufacturer Part Number: CC0805GKNPO9BN222; Package Size: 0805; JLCPCB Basic Part: No; JLCPCB Part Number: C309482; Supplier 1: LCSC; Category: Capacitors - MLCC; Supplier Part Number 1: C309482; Tolerance: ±2%; Voltage Rating: 50V; Temperature Coefficient: NP0; RoHS: Yes; ComponentLink1Description: Datasheet; ComponentLink1URL: https://wmsc.lcsc.com/wmsc/upload/file/pdf/v2/lcsc/2304140030_YAGEO-CC0805GKNPO9BN222_C309482.pdf; ComponentLink2Description: JLCPCB Part URL; ComponentLink2URL: https://jlcpcb.com/partdetail/C309482; ComponentLink3Description: LCSC Part URL; ComponentLink3URL: https://lcsc.com/product-detail/Multilayer-Ceramic-Capacitors-MLCC---SMD-SMT_YAGEO-YAGEO-CC0805GKNPO9BN222_C309482.html
footprint CAP-0805 (0805 (2012M) Capacitor)
pins: 1, 2

## CC0805GKNPO9BN272
designator C?  Capacitance: 2.7nF  (hidden comment: *)
Capacitor, Ceramic (MLCC), 2.7nF, ±2%, 50V, NP0, ±2%, SMD 0805; Manufacturer: YAGEO; Manufacturer Part Number: CC0805GKNPO9BN272; Package Size: 0805; JLCPCB Basic Part: No; JLCPCB Part Number: C541551; Supplier 1: LCSC; Category: Capacitors - MLCC; Supplier Part Number 1: C541551; Tolerance: ±2%; Voltage Rating: 50V; Temperature Coefficient: NP0; RoHS: Yes; ComponentLink1Description: Datasheet; ComponentLink1URL: https://wmsc.lcsc.com/wmsc/upload/file/pdf/v2/lcsc/2006151144_YAGEO-CC0805GKNPO9BN272_C541551.pdf; ComponentLink2Description: JLCPCB Part URL; ComponentLink2URL: https://jlcpcb.com/partdetail/C541551; ComponentLink3Description: LCSC Part URL; ComponentLink3URL: https://lcsc.com/product-detail/Multilayer-Ceramic-Capacitors-MLCC---SMD-SMT_YAGEO-YAGEO-CC0805GKNPO9BN272_C541551.html
footprint CAP-0805 (0805 (2012M) Capacitor)
pins: 1, 2

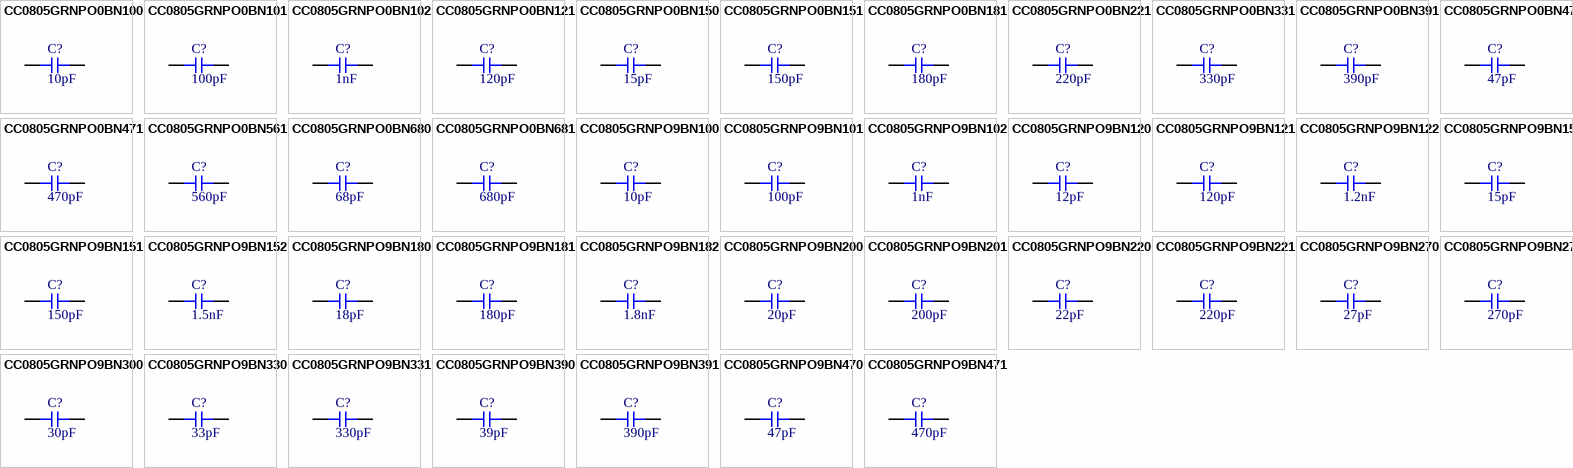
[diagram p33: symbols CC0805GRNPO0BN100 to CC0805GRNPO9BN471]

## CC0805GRNPO0BN100
designator C?  Capacitance: 10pF  (hidden comment: *)
Capacitor, Ceramic (MLCC), 10pF, ±2%, 100V, NP0, ±2%, SMD 0805; Manufacturer: YAGEO; Manufacturer Part Number: CC0805GRNPO0BN100; Package Size: 0805; JLCPCB Basic Part: No; JLCPCB Part Number: C527191; Supplier 1: LCSC; Category: Capacitors - MLCC; Supplier Part Number 1: C527191; Tolerance: ±2%; Voltage Rating: 100V; Temperature Coefficient: NP0; RoHS: Yes; ComponentLink1Description: Datasheet; ComponentLink1URL: https://wmsc.lcsc.com/wmsc/upload/file/pdf/v2/lcsc/2311211121_YAGEO-CC0805GRNPO0BN100_C527191.pdf; ComponentLink2Description: JLCPCB Part URL; ComponentLink2URL: https://jlcpcb.com/partdetail/C527191; ComponentLink3Description: LCSC Part URL; ComponentLink3URL: https://lcsc.com/product-detail/Multilayer-Ceramic-Capacitors-MLCC---SMD-SMT_YAGEO-YAGEO-CC0805GRNPO0BN100_C527191.html
footprint CAP-0805 (0805 (2012M) Capacitor)
pins: 1, 2

## CC0805GRNPO0BN101
designator C?  Capacitance: 100pF  (hidden comment: *)
Capacitor, Ceramic (MLCC), 100pF, ±2%, 100V, NP0, ±2%, SMD 0805; Manufacturer: YAGEO; Manufacturer Part Number: CC0805GRNPO0BN101; Package Size: 0805; JLCPCB Basic Part: No; JLCPCB Part Number: C527192; Supplier 1: LCSC; Category: Capacitors - MLCC; Supplier Part Number 1: C527192; Tolerance: ±2%; Voltage Rating: 100V; Temperature Coefficient: NP0; RoHS: Yes; ComponentLink1Description: Datasheet; ComponentLink1URL: https://wmsc.lcsc.com/wmsc/upload/file/pdf/v2/lcsc/2005222139_YAGEO-CC0805GRNPO0BN101_C527192.pdf; ComponentLink2Description: JLCPCB Part URL; ComponentLink2URL: https://jlcpcb.com/partdetail/C527192; ComponentLink3Description: LCSC Part URL; ComponentLink3URL: https://lcsc.com/product-detail/Multilayer-Ceramic-Capacitors-MLCC---SMD-SMT_YAGEO-YAGEO-CC0805GRNPO0BN101_C527192.html
footprint CAP-0805 (0805 (2012M) Capacitor)
pins: 1, 2

## CC0805GRNPO0BN102
designator C?  Capacitance: 1nF  (hidden comment: *)
Capacitor, Ceramic (MLCC), 1nF, ±2%, 100V, NP0, ±2%, SMD 0805; Manufacturer: YAGEO; Manufacturer Part Number: CC0805GRNPO0BN102; Package Size: 0805; JLCPCB Basic Part: No; JLCPCB Part Number: C576911; Supplier 1: LCSC; Category: Capacitors - MLCC; Supplier Part Number 1: C576911; Tolerance: ±2%; Voltage Rating: 100V; Temperature Coefficient: NP0; RoHS: Yes; ComponentLink1Description: Datasheet; ComponentLink1URL: https://wmsc.lcsc.com/wmsc/upload/file/pdf/v2/lcsc/2311211121_YAGEO-CC0805GRNPO0BN102_C576911.pdf; ComponentLink2Description: JLCPCB Part URL; ComponentLink2URL: https://jlcpcb.com/partdetail/C576911; ComponentLink3Description: LCSC Part URL; ComponentLink3URL: https://lcsc.com/product-detail/Multilayer-Ceramic-Capacitors-MLCC---SMD-SMT_YAGEO-YAGEO-CC0805GRNPO0BN102_C576911.html
footprint CAP-0805 (0805 (2012M) Capacitor)
pins: 1, 2

## CC0805GRNPO0BN121
designator C?  Capacitance: 120pF  (hidden comment: *)
Capacitor, Ceramic (MLCC), 120pF, ±2%, 100V, NP0, ±2%, SMD 0805; Manufacturer: YAGEO; Manufacturer Part Number: CC0805GRNPO0BN121; Package Size: 0805; JLCPCB Basic Part: No; JLCPCB Part Number: C1853375; Supplier 1: LCSC; Category: Capacitors - MLCC; Supplier Part Number 1: C1853375; Tolerance: ±2%; Voltage Rating: 100V; Temperature Coefficient: NP0; RoHS: Yes; ComponentLink1Description: Datasheet; ComponentLink1URL: https://wmsc.lcsc.com/wmsc/upload/file/pdf/v2/lcsc/2201271030_YAGEO-CC0805GRNPO0BN121_C1853375.pdf; ComponentLink2Description: JLCPCB Part URL; ComponentLink2URL: https://jlcpcb.com/partdetail/C1853375; ComponentLink3Description: LCSC Part URL; ComponentLink3URL: https://lcsc.com/product-detail/Multilayer-Ceramic-Capacitors-MLCC---SMD-SMT_YAGEO-YAGEO-CC0805GRNPO0BN121_C1853375.html
footprint CAP-0805 (0805 (2012M) Capacitor)
pins: 1, 2

## CC0805GRNPO0BN150
designator C?  Capacitance: 15pF  (hidden comment: *)
Capacitor, Ceramic (MLCC), 15pF, ±2%, 100V, NP0, ±2%, SMD 0805; Manufacturer: YAGEO; Manufacturer Part Number: CC0805GRNPO0BN150; Package Size: 0805; JLCPCB Basic Part: No; JLCPCB Part Number: C576915; Supplier 1: LCSC; Category: Capacitors - MLCC; Supplier Part Number 1: C576915; Tolerance: ±2%; Voltage Rating: 100V; Temperature Coefficient: NP0; RoHS: Yes; ComponentLink1Description: Datasheet; ComponentLink1URL: https://wmsc.lcsc.com/wmsc/upload/file/pdf/v2/lcsc/2311211121_YAGEO-CC0805GRNPO0BN150_C576915.pdf; ComponentLink2Description: JLCPCB Part URL; ComponentLink2URL: https://jlcpcb.com/partdetail/C576915; ComponentLink3Description: LCSC Part URL; ComponentLink3URL: https://lcsc.com/product-detail/Multilayer-Ceramic-Capacitors-MLCC---SMD-SMT_YAGEO-YAGEO-CC0805GRNPO0BN150_C576915.html
footprint CAP-0805 (0805 (2012M) Capacitor)
pins: 1, 2

## CC0805GRNPO0BN151
designator C?  Capacitance: 150pF  (hidden comment: *)
Capacitor, Ceramic (MLCC), 150pF, ±2%, 100V, NP0, ±2%, SMD 0805; Manufacturer: YAGEO; Manufacturer Part Number: CC0805GRNPO0BN151; Package Size: 0805; JLCPCB Basic Part: No; JLCPCB Part Number: C576916; Supplier 1: LCSC; Category: Capacitors - MLCC; Supplier Part Number 1: C576916; Tolerance: ±2%; Voltage Rating: 100V; Temperature Coefficient: NP0; RoHS: Yes; ComponentLink1Description: Datasheet; ComponentLink1URL: https://wmsc.lcsc.com/wmsc/upload/file/pdf/v2/lcsc/2212091030_YAGEO-CC0805GRNPO0BN151_C576916.pdf; ComponentLink2Description: JLCPCB Part URL; ComponentLink2URL: https://jlcpcb.com/partdetail/C576916; ComponentLink3Description: LCSC Part URL; ComponentLink3URL: https://lcsc.com/product-detail/Multilayer-Ceramic-Capacitors-MLCC---SMD-SMT_YAGEO-YAGEO-CC0805GRNPO0BN151_C576916.html
footprint CAP-0805 (0805 (2012M) Capacitor)
pins: 1, 2

## CC0805GRNPO0BN181
designator C?  Capacitance: 180pF  (hidden comment: *)
Capacitor, Ceramic (MLCC), 180pF, ±2%, 100V, NP0, ±2%, SMD 0805; Manufacturer: YAGEO; Manufacturer Part Number: CC0805GRNPO0BN181; Package Size: 0805; JLCPCB Basic Part: No; JLCPCB Part Number: C1853371; Supplier 1: LCSC; Category: Capacitors - MLCC; Supplier Part Number 1: C1853371; Tolerance: ±2%; Voltage Rating: 100V; Temperature Coefficient: NP0; RoHS: Yes; ComponentLink1Description: Datasheet; ComponentLink1URL: https://wmsc.lcsc.com/wmsc/upload/file/pdf/v2/lcsc/2201271030_YAGEO-CC0805GRNPO0BN181_C1853371.pdf; ComponentLink2Description: JLCPCB Part URL; ComponentLink2URL: https://jlcpcb.com/partdetail/C1853371; ComponentLink3Description: LCSC Part URL; ComponentLink3URL: https://lcsc.com/product-detail/Multilayer-Ceramic-Capacitors-MLCC---SMD-SMT_YAGEO-YAGEO-CC0805GRNPO0BN181_C1853371.html
footprint CAP-0805 (0805 (2012M) Capacitor)
pins: 1, 2
